# Altium footprint library THU VIEN PCB.PCBLib: 911 footprints (part 7 of 57)
Each footprint in its own frame and in the unit in brackets; x right, y up, seen from the top. Pads: shape width x height; smd on the part's side, far side on the other; paste and mask are expansions set on the pad; w line width, h text height; cw(c..) or ccw(c..) is an arc to the next point about the centre after c.
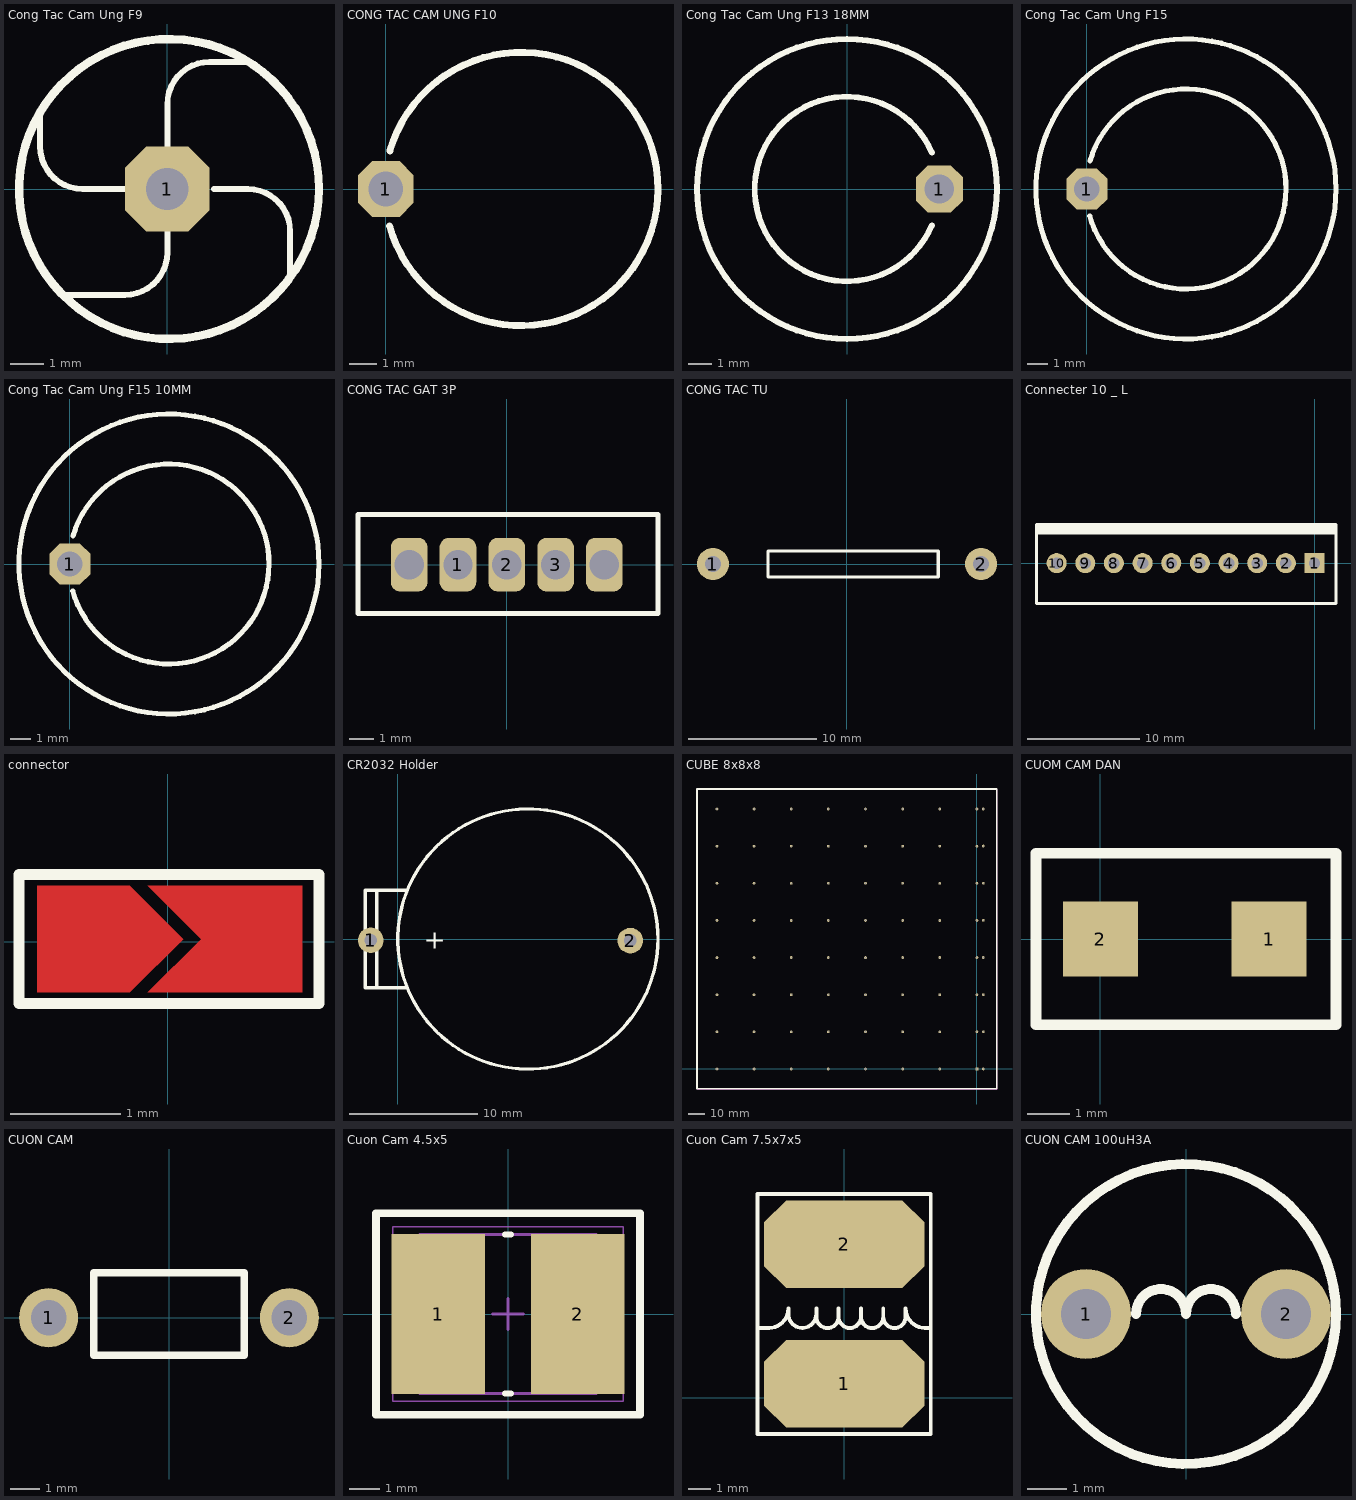
[diagram p6: the footprints below, top view; thin cyan lines are the x and y axes]

## Cong Tac Cam Ung F9 [mil]
pads (1):
  oct 100x100 hole 50: 1(0,0)
Top Overlay:
  circle w10: c2,0 r177
  lines w7: -150,90 -150,50 ccw(c-100,50) -100,0 -50,0 ; -125,-125 -50,-125 ccw(c-50,-75) 0,-75 0,-50 ; 0,50 0,100 cw(c50,100) 50,150 95,150 ; 55,0 95,0 cw(c95,-50) 145,-50 145,-100

## CONG TAC CAM UNG F10 [mil]
pads (1):
  oct 80x80 hole 50: 1(0,0)
Top Overlay:
  lines w10: 5.54,-53.44 ccw(c195,0) 5.91,54.74

## Cong Tac Cam Ung F13 18MM [mil]
pads (1):
  oct 80x80 hole 50: 1(157.48,0)
Top Overlay:
  circle w10: c0,0 r255.91
  lines w10: 144.75,-62.03 cw(c0,0) 144.75,62.03

## Cong Tac Cam Ung F15 [mil]
pads (1):
  oct 80x80 hole 50: 1(0,0)
Top Overlay:
  circle w10: c195,0 r295.28
  lines w10: 5.54,-53.44 ccw(c195,0) 5.91,54.74

## Cong Tac Cam Ung F15 10MM [mil]
pads (1):
  oct 80x80 hole 50: 1(0,0)
Top Overlay:
  circle w10: c195,0 r295.28
  lines w10: 5.54,-53.44 ccw(c195,0) 5.91,54.74

## CONG TAC GAT 3P [mm]
pads (5):
  rrect50% 1.5x2.2 hole 1.2: 1(-2,0) 2(0,0) 3(2,0) ""(-4,0) ""(4,0)
Top Overlay:
  lines w0.2: -6.096,-2.007 -6.096,2.057 6.198,2.057 6.198,-2.007 -6.096,-2.007

## CONG TAC TU [mm]
pads (2):
  round 2.5 hole 1.27: 1(-10.5,0) 2(10.5,0)
Top Overlay:
  lines w0.254: -6.182,-1.016 7.153,-1.016 7.153,1.016 -6.182,1.016 -6.182,-0.984

## Connecter 10 _ L [mil]
height 30
pads (10):
  rect 70x70 hole 40: 1(0,0)
  round 70 hole 40: 2(-100,0) 3(-200,0) 4(-300,0) 5(-400,0) 6(-500,0) 7(-600,0) 8(-700,0) 9(-800,0) 10(-900,0)
Top Overlay:
  rectangle: -972,99 75,135
  lines w10: 74.88,134 74.88,-141.59 -970,-141.59 -970,134 75,134
3D body "Header 10 1mm.stp": height 237.17, standoff 0.61, extent -942.17,-423.07 42.17,10

## connector [mil]
Top Layer:
  region: -7,20 12,1 -7,-18 48,-18 48,20
  region: -46.5,20 -13.5,20 5.5,1 -13.5,-18 -46.5,-18
Top Overlay:
  lines w4: -53,-22 54,-22 54,24 -53,24 -53,-22

## CR2032 Holder [mm]
pads (2):
  round 2 hole 1: 1(-2.108,-0.102) 2(18.161,-0.127)
Top Overlay:
  circle w0.254: c10.16,0 r10.161
  lines w0.254: -1.651,-3.81 -1.651,3.81 ; 0.635,-3.81 -2.54,-3.81 -2.54,3.81 0.635,3.81
  text "+" at 2.032,-0.762 h1.52
3D body "CR2032_HOR_HOLD.step": height 8.52, standoff -3.98, extent -3.213,-11.076 21.287,10.924

## CUBE 8x8x8 [mm]
pads (72):
  rect 1.7x1.7 hole 1: 1(0,0)
  round 1.7 hole 1: 2(-23,0) 3(-46,0) 4(-69,0) 5(-92,0) 6(-115,0) 7(-138,0) 8(-161,0) 9(0,23) 10(-23,23) 11(-46,23) 12(-69,23) 13(-92,23) 14(-115,23) 15(-138,23) 16(-161,23) 17(0,46) 18(-23,46) 19(-46,46) 20(-69,46) 21(-92,46) 22(-115,46) 23(-138,46) 24(-161,46) 25(0,69) 26(-23,69) 27(-46,69) 28(-69,69) 29(-92,69) 30(-115,69) 31(-138,69) 32(-161,69) 33(0,92) 34(-23,92) 35(-46,92) 36(-69,92) 37(-92,92) 38(-115,92) 39(-138,92) 40(-161,92) 41(0,115) 42(-23,115) 43(-46,115) 44(-69,115) 45(-92,115) 46(-115,115) 47(-138,115) 48(-161,115) 49(0,138) 50(-23,138) 51(-46,138) 52(-69,138) 53(-92,138) 54(-115,138) 55(-138,138) 56(-161,138) 57(0,161) 58(-23,161) 59(-46,161) 60(-69,161) 61(-92,161) 62(-115,161) 63(-138,161) 64(-161,161) 65(4,161) 66(4,138.05) 67(4,115.05) 68(4,92.05) 69(4,69.05) 70(4,46.05) 71(4,23.05) 72(4,0.05)
Top Overlay:
  lines w1.016: -173.35,-12.3 -173.35,173.4 12.35,173.4 12.35,-12.3 -173.35,-12.3
Keep-Out Layer:
  lines w0.762: -173.228,-12.396 -173.228,173.278 12.446,173.278 12.446,-12.396 -173.228,-12.396

## CUOM CAM DAN [mil]
pads (2):
  rect 70x70 smd: 1(157.48,0) 2(0,0)
Top Overlay:
  lines w10: -60,-80 220,-80 220,80 -60,80 -60,-80

## CUON CAM [mm] "Dang cam giong tro"
pads (2):
  round 2 hole 1.2: 1(-4.064,0) 2(4.064,0)
Top Overlay:
  lines w0.254: -2.54,-1.27 2.54,-1.27 2.54,1.524 -2.54,1.524 -2.54,-1.27

## Cuon Cam 4.5x5 [mm] "Precision Wire Wound Inductor, 2-Leads, Body 5.80x5.20mm, IPC Medium Density"
height 2.29
pads (2):
  rect 3.05x5.25 smd: 1(-2.286,0) 2(2.286,0)
Top Overlay:
  lines w0.2: -0.1,-2.6 0.1,-2.6 ; -0.1,2.6 0.1,2.6
  lines w0.254: -4.318,-3.302 -4.318,3.302 4.318,3.302 4.318,-3.302 -4.318,-3.302
Mechanical 13:
  lines w0.1: -2.9,-2.6 2.9,-2.6 2.9,2.6 -2.9,2.6 -2.9,-2.6
Mechanical 15:
  lines w0.05: -3.775,-2.85 3.775,-2.85 3.775,2.85 -3.775,2.85 -3.775,-2.85
  lines w0.1: -0.5,0 0.5,0 ; 0,-0.5 0,0.5
3D body: height 2.29, standoff 0, extent -2.9,-2.6 2.9,2.6

## Cuon Cam 7.5x7x5 [mm]
pads (2):
  oct 7.3x4 smd: 1(0,0.635) 2(0,6.985)
Top Overlay:
  lines w0.178: -3.937,3.175 -3.429,3.175 ccw(c-3.429,4.064) -2.54,4.064 -2.54,3.81 ccw(c-1.905,3.81) -1.905,3.175 ccw(c-1.905,3.81) -1.27,3.81 -1.27,4.064 -1.27,3.683 ccw(c-0.762,3.683) -0.762,3.175 ccw(c-0.762,3.683) -0.254,3.683 ; 3.937,3.175 3.683,3.175 cw(c3.683,4.064) 2.794,4.064 2.794,3.683 cw(c2.286,3.683) 2.286,3.175 cw(c2.286,3.683) 1.778,3.683 ; -0.254,3.683 ccw(c0.254,3.683) 0.254,3.175 ccw(c0.254,3.683) 0.762,3.683 ; -0.254,3.683 -0.254,4.064 -0.254,3.683 ; 0.762,3.683 ccw(c1.27,3.683) 1.27,3.175 ccw(c1.27,3.683) 1.778,3.683 ; 0.762,3.683 0.762,4.064 0.762,3.683 ; 1.778,3.683 1.778,4.064 1.778,3.683 ; -3.937,-1.651 3.937,-1.651 3.937,9.271 -3.937,9.271 -3.937,-1.651
3D body "cuon cam 75.step": height 5.02, standoff 0.01, extent -3.5,0.069 3.5,7.805

## CUON CAM 100uH3A [mil] "100uH3A"
pads (2):
  round 90 hole 50: 1(-100,0) 2(100,0)
Top Overlay:
  circle w10: c0,0 r150
  lines w10: -50,0 cw(c-25,0) 0,0 cw(c25,0) 50,0
3D body "cuon cam cam 1A.step": height 394.18, standoff -196.37, extent -171.27,-175.26 171.25,167.26